# Altium footprint library mobinbyn-Socket.PcbLib: 131 footprints (part 5 of 9)
Each footprint in its own frame and in the unit in brackets; x right, y up, seen from the top. Pads: shape width x height; smd on the part's side, far side on the other; paste and mask are expansions set on the pad; w line width, h text height; cw(c..) or ccw(c..) is an arc to the next point about the centre after c.
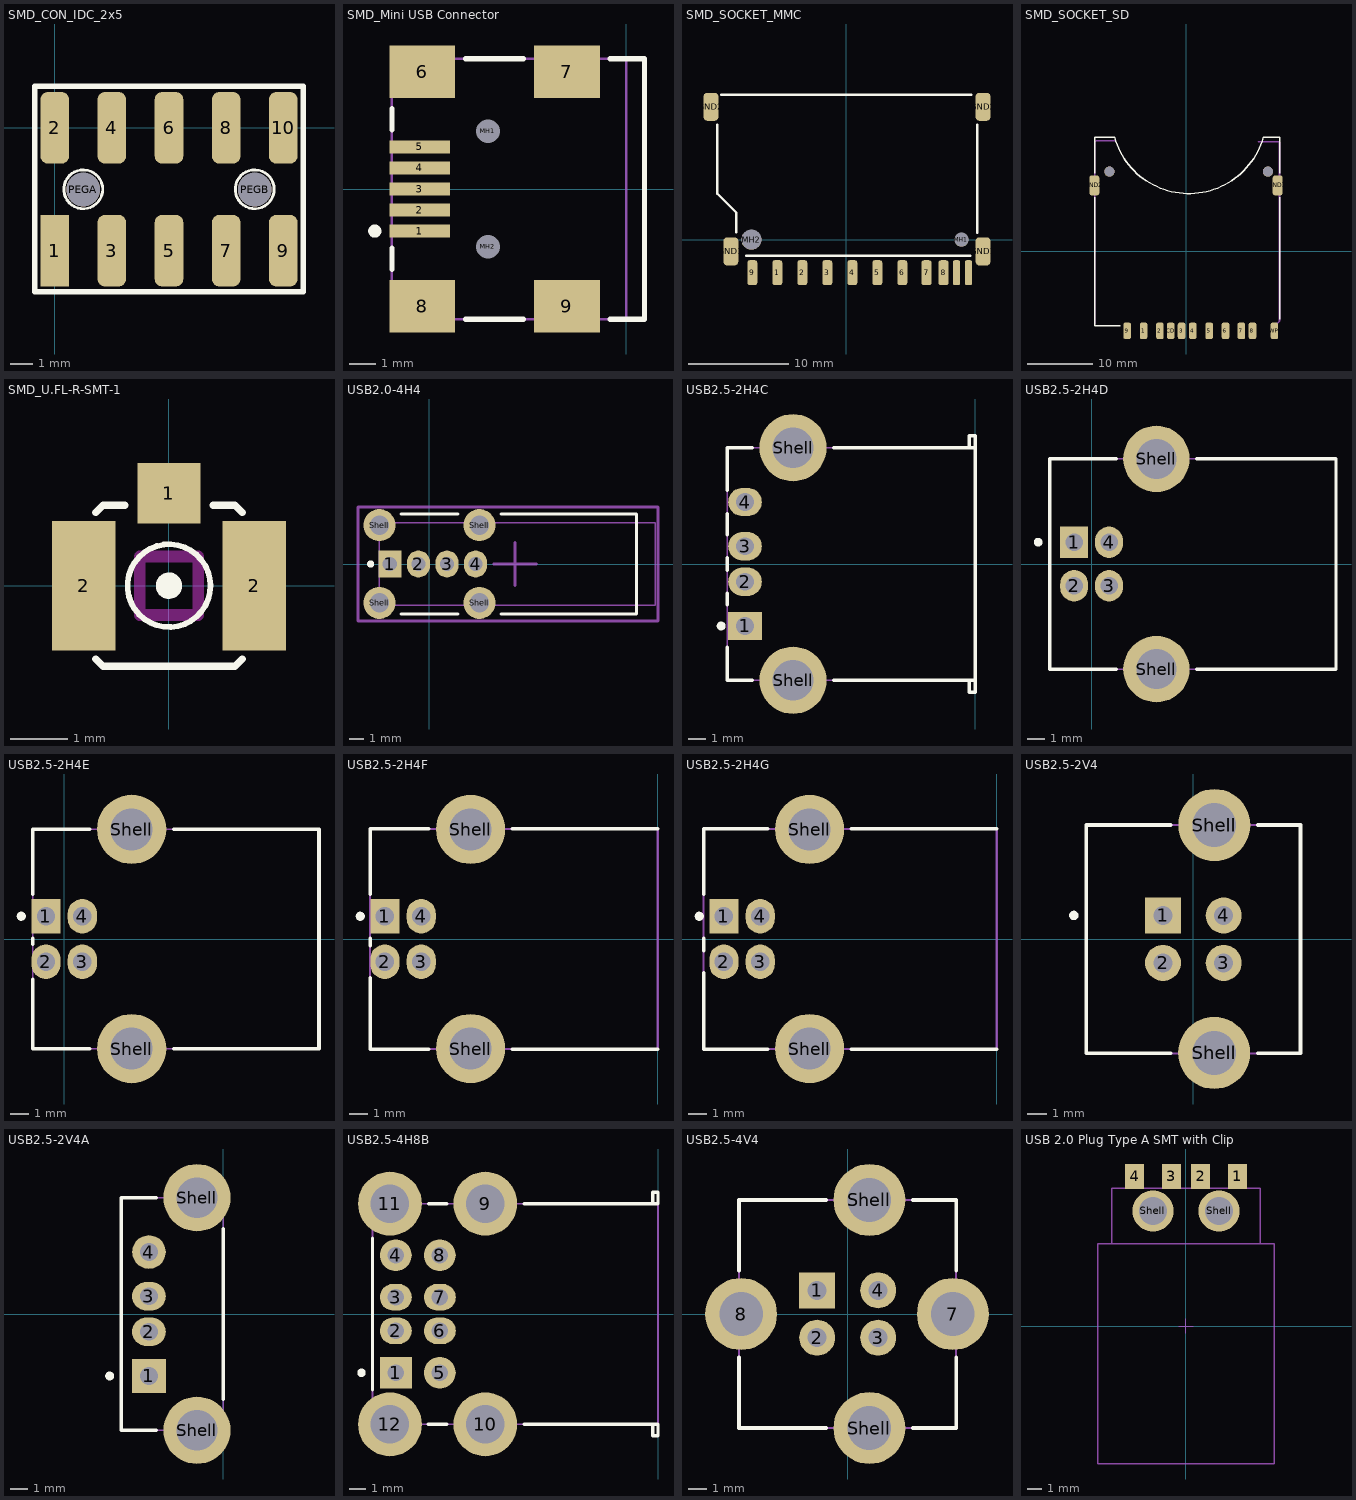
[diagram p4: the footprints below, top view; thin cyan lines are the x and y axes]

## SMD_CON_IDC_2x5 [mil]
pads (12):
  rect 50x125 smd: 1(0,-215)
  rrect50% 50x125 smd: 2(0,0) 3(100,-215) 4(100,0) 5(200,-215) 6(200,0) 7(300,-215) 8(300,0) 9(400,-215) 10(400,0)
  round 59.05 hole 59.06 unplated mask+1.5: PEGA(50,-108) PEGB(350,-108)
Top Overlay:
  circle w5: c350,-107.52 r34.06
  circle w5: c50,-107.52 r34.06
  lines w10: -35,-287 -35,73 435,73 435,-287 -35,-287
3D body "TSM-105-01-X-DV-A.STEP": height 380, standoff -50, extent -52.1,-253.19 447.9,36.8
3D body "10 Pin (2.5 mm Pitch) IDC Connector.stp": height 3028.11, standoff 154.09, extent -142.37,-270.22 538.39,60.43

## SMD_Mini USB Connector [mm]
pads (11):
  rect 2.3x0.5 smd: 1(-7.85,-1.6) 2(-7.85,-0.8) 3(-7.85,0) 4(-7.85,0.8) 5(-7.85,1.6)
  rect 2.5x2 smd: 6(-7.75,4.45) 7(-2.25,4.45) 8(-7.75,-4.45) 9(-2.25,-4.45)
  round 0.6 hole 0.9 unplated: MH1(-5.25,2.2) MH2(-5.25,-2.2)
Top Overlay:
  circle w0.25: c-9.55,-1.6 r0.125
  lines w0.2: -8.9,-3.05 -8.9,-2.25 ; -8.9,2.25 -8.9,3.05 ; -6.1,-4.95 -3.9,-4.95 ; -6.1,4.95 -3.9,4.95 ; -0.6,-4.95 0.7,-4.95 0.7,4.95 -0.6,4.95
Mechanical 1:
  lines w0.1: 0,-4.95 0,4.95
  text "PCB Edge" at 0.432,-4.036 h0.25
Mechanical 13:
  lines w0.1: -8.9,-4.95 0.7,-4.95 0.7,4.95 -8.9,4.95 -8.9,-4.95
3D body "usb_a-usb_b-m5-smd-c.STEP": height 3.93, standoff -1, extent -8.6,-4.95 0.65,4.95

## SMD_SOCKET_MMC [mm]
height 2
pads (17):
  rrect50% 1x2.5 smd: 1(-6.915,-3.3) 2(-4.415,-3.3) 3(-1.915,-3.3) 4(0.585,-3.3) 5(3.085,-3.3) 6(5.585,-3.3) 7(8.01,-3.3) 8(9.71,-3.3) 9(-9.415,-3.3)
  rrect50% 0.7x2.5 smd: CD(11.01,-3.3) WP(12.21,-3.3)
  rrect50% 1.5x2.8 smd: GND1(-11.56,-1.166) GND1(13.66,-1.166) GND2(-13.544,13.3) GND2(13.66,13.3)
  round 1.4 hole 1.4: MH1(11.5,0)
  round 2 hole 2: MH2(-9.5,0)
Top Overlay:
  lines w0.254: -12.9,11.506 -12.9,4.6 -11,2.7 -11,0.764 ; -12.5,14.5 12.5,14.5 ; -10,-1.6 12.4,-1.6 ; 13.1,0.711 13.1,11.506
3D body "693063020911.stp": height 2.95, standoff -0.6, extent -13.39,-3.285 13.61,14.465
3D body "SD card.stp": height 2.23, standoff 0.13, extent -11.716,0.715 12.284,32.715

## SMD_SOCKET_SD [mm] "KSDC012551"
pads (15):
  rrect50% 1.16x2.5 smd: 1(-6.48,-12.15) 2(-3.98,-12.15) 3(-0.68,-12.15) 4(1.03,-12.15) 5(3.53,-12.15) 6(6.03,-12.15) 7(8.45,-12.15) 8(10.15,-12.15) 9(-8.98,-12.15) CD(-2.33,-12.15) WP(13.5,-12.15)
  rrect50% 1.524x3.048 smd: GND1(14,10.05) GND2(-14,10.05)
  round 1.55 hole 1.55 unplated: MH1(12.5,12.15) MH2(-11.7,12.15)
Top Overlay:
  lines w0.2: -13.919,8.255 -13.919,-11.4 -10,-11.4 ; -13.919,11.938 -13.919,17.396 -10.915,17.396 ccw(c0.441,20.6) 11.799,17.4 14.275,17.4 14.275,11.938 ; 14.275,-10.414 14.275,8.255
Mechanical 13:
  lines w0.254: -13.919,-11.024 -13.919,16.662 -13.716,16.866 -10.871,16.866 ; 11.024,16.739 14.122,16.739 14.275,16.586 14.275,-10.684 13.813,-11.146
3D body "SD card.stp": height 2.23, standoff 0.13, extent -11.58,-10.395 12.42,21.605
3D body "c-1734472-1-a2-3d.stp": height 2.73, standoff -0.63, extent -14.3,-12.573 14.2,17.727

## SMD_U.FL-R-SMT-1 [mm]
pads (3):
  rect 1.1x1.05 smd: 1(0,1.6)
  rect 1.1x2.25 smd: 2(-1.475,0) 2(1.475,0)
Top Overlay:
  circle w0.1: c0,0 r0.718
  circle w0.1: c0,0 r0.18
  region: 0,-0.18 -0.036,-0.18 -0.102,-0.152 -0.152,-0.102 -0.18,-0.036 -0.18,0 -0.18,0.036 -0.152,0.102 -0.102,0.152 -0.036,0.18 0,0.18 0.036,0.18 0.102,0.152 0.152,0.102 0.18,0.036 0.18,0 0.18,-0.036 0.152,-0.102 0.102,-0.152 0.036,-0.18
  lines w0.127: -1.27,-1.27 -1.143,-1.397 1.143,-1.397 1.27,-1.27 ; -1.27,1.27 -1.143,1.397 -0.762,1.397 ; 0.762,1.397 1.143,1.397 1.27,1.27
Keep-Out Layer:
  lines w0.203: -0.508,-0.508 0.508,-0.508 0.508,0.508 -0.508,0.508 -0.508,-0.508
3D body "SW3dPS-U.FL-R-SMT-1.STEP": height 1.25, standoff -0.01, extent -1.5,-1.55 1.5,1.55

## USB2.0-4H4 [mm] "Connector; USB1.1, Type A, Thru-Hole; 4 Position; Right Angle"
height 13.83
pads (8):
  rect 1.6x1.9 hole 1: 1(-2.77,0)
  oval 1.6x1.9 hole 1: 2(-0.77,0) 3(1.23,0) 4(3.23,0)
  round 2.25 hole 1.35: Shell(-3.5,-2.72) Shell(-3.5,2.72) Shell(3.5,-2.72) Shell(3.5,2.72)
Top Overlay:
  circle w0.25: c-4.12,0 r0.125
  lines w0.2: -1.98,-3.5 2,-3.5 ; -1.98,3.5 2,3.5 ; 5.01,-3.5 14.5,-3.5 14.5,3.5 5.01,3.5
Mechanical 13:
  lines w0.1: -3.5,-2.88 -3.5,2.88 15.79,2.88 15.79,-2.88 -3.5,-2.88
Mechanical 15:
  lines w0.2: 4.5,0 7.5,0 ; 6,-1.5 6,1.5 ; -5,-4 16,-4 16,4 -5,4 -5,-4
3D body "usb_a-usb_a-e.stp": height 14.25, standoff -3.9, extent -3.995,-3.564 15.255,3.556

## USB2.5-2H4C [mm] "Connector; USB1.1, Type A, Thru-Hole; 4 Position; Right Angle"
height 7.01
pads (6):
  rect 1.9x1.6 hole 1: 1(-12.99,-3.5)
  oval 1.9x1.6 hole 1: 2(-12.99,-1) 3(-12.99,1) 4(-12.99,3.5)
  round 3.8 hole 2.3: Shell(-10.28,-6.57) Shell(-10.28,6.57)
Top Overlay:
  circle w0.25: c-14.34,-3.5 r0.125
  lines w0.2: -14,-4.7 -14,-6.565 -12.58,-6.565 ; -14,-2.3 -14,-1.66 ; -14,-0.34 -14,0.34 ; -14,1.66 -14,2.84 ; -14,4.16 -14,6.565 -12.58,6.565 ; -7.98,-6.565 0,-6.565 ; -7.98,6.565 0,6.565 ; -0.32,-6.565 -0.32,-7.25 0,-7.25 0,-6.565 ; -0.32,6.565 -0.32,7.25 0,7.25 0,6.565 ; 0,-6.565 0,6.565
Mechanical 13:
  lines w0.1: -14,-6.565 -14,6.565 -0.32,6.565 -0.32,7.25 0,7.25 0,-7.25 -0.32,-7.25 -0.32,-6.565 -14,-6.565
3D body "14388.STEP": height 7.35, standoff -3.5, extent -14.402,-7.9 0.098,7.9

## USB2.5-2H4D [mm] "Connector; USB1.1, Type B, Thru-Hole; 4 Position; Right Angle"
height 11.1
pads (6):
  rect 1.6x1.8 hole 1: 1(-1,1.25)
  oval 1.6x1.8 hole 1: 2(-1,-1.25) 3(1,-1.25) 4(1,1.25)
  round 3.8 hole 2.3: Shell(3.71,-6.02) Shell(3.71,6.02)
Top Overlay:
  circle w0.25: c-3.06,1.25 r0.125
  lines w0.2: 1.41,-6.02 -2.41,-6.02 -2.41,6.02 1.41,6.02 ; 6.01,-6.02 13.99,-6.02 13.99,6.02 6.01,6.02
Mechanical 13:
  lines w0.1: -2.41,-6.02 13.99,-6.02 13.99,6.02 -2.41,6.02 -2.41,-6.02
3D body "Samtec-DEFAULT.STEP": height 11.05, standoff 0.55, extent 3.937,-5.625 69.887,5.575
3D body "14389.STEP": height 10.95, standoff -3.7, extent -2.5,-7.45 14,7.45

## USB2.5-2H4E [mm] "Connector; USB1.1, Type B, Thru-Hole; 4 Position; Right Angle"
height 11.5
pads (6):
  rect 1.6x1.9 hole 1: 1(-1,1.25)
  oval 1.6x1.9 hole 1: 2(-1,-1.25) 3(1,-1.25) 4(1,1.25)
  round 3.8 hole 2.3: Shell(3.71,-6.02) Shell(3.71,6.02)
Top Overlay:
  circle w0.25: c-2.35,1.25 r0.125
  lines w0.2: -1.72,-2.21 -1.72,-6.02 1.41,-6.02 ; -1.72,-0.29 -1.72,0.05 ; -1.72,2.45 -1.72,6.02 1.41,6.02 ; 6.01,-6.02 13.99,-6.02 13.99,6.02 6.01,6.02
Mechanical 13:
  lines w0.1: -1.72,-6.02 -1.72,6.02 13.99,6.02 13.99,-6.02 -1.72,-6.02
3D body "14389.STEP": height 10.95, standoff -3.7, extent -2.5,-7.45 14,7.45

## USB2.5-2H4F [mm] "Connector; USB1.1, Type B, Thru-Hole; 4 Position; Right Angle"
height 10.95
pads (6):
  rect 1.6x1.9 hole 1: 1(-15.01,1.25)
  oval 1.6x1.9 hole 1: 2(-15.01,-1.25) 3(-13.01,-1.25) 4(-13.01,1.25)
  round 3.8 hole 2.3: Shell(-10.3,-6.02) Shell(-10.3,6.02)
Top Overlay:
  circle w0.25: c-16.36,1.25 r0.125
  lines w0.2: -15.82,-2.14 -15.82,-6.05 -12.6,-6.05 ; -15.82,-0.36 -15.82,0.05 ; -15.82,2.45 -15.82,6.05 -12.6,6.05 ; -8,-6.05 -0.02,-6.05 ; -8,6.05 -0.02,6.05
Mechanical 1:
  lines w0.1: 0,-6.05 0,6.05
  text "PCB Edge" at -0.325,-5.651 h0.25
Mechanical 13:
  lines w0.1: -15.82,-6.05 -0.02,-6.05 -0.02,6.05 -15.82,6.05 -15.82,-6.05
3D body "14389.STEP": height 10.95, standoff -3.7, extent -16.51,-7.45 -0.01,7.45

## USB2.5-2H4G [mm] "Connector; USB1.1, Type B, Thru-Hole; 4 Position; Right Angle"
height 10.95
pads (6):
  rect 1.6x1.9 hole 1: 1(-15.01,1.25)
  oval 1.6x1.9 hole 1: 2(-15.01,-1.25) 3(-13.01,-1.25) 4(-13.01,1.25)
  round 3.8 hole 2.3: Shell(-10.3,-6.02) Shell(-10.3,6.02)
Top Overlay:
  circle w0.25: c-16.36,1.25 r0.125
  lines w0.2: -16.12,-1.85 -16.12,-6.05 -12.6,-6.05 ; -16.12,-0.65 -16.12,0.05 ; -16.12,2.45 -16.12,6.05 -12.6,6.05 ; -8,-6.05 -0.02,-6.05 ; -8,6.05 -0.02,6.05
Mechanical 1:
  lines w0.1: 0,-6.05 0,6.05
  text "PCB Edge" at -0.325,-5.651 h0.25
Mechanical 13:
  lines w0.1: -16.12,-6.05 -16.12,6.05 -0.02,6.05 -0.02,-6.05 -16.12,-6.05
3D body "Samtec-DEFAULT.STEP": height 11.05, standoff 0.55, extent -10.073,-5.625 55.877,5.575
3D body "14389.STEP": height 10.95, standoff -3.7, extent -16.51,-7.45 -0.01,7.45

## USB2.5-2V4 [mm] "Connector; USB1.1, Type B, Thru-Hole; 4 Position; Vertical"
height 16
pads (6):
  rect 1.9x1.9 hole 1: 1(-1.6,1.25)
  round 1.9 hole 1: 2(-1.6,-1.25) 3(1.6,-1.25) 4(1.6,1.25)
  round 3.8 hole 2.3: Shell(1.1,-6) Shell(1.11,6.02)
Top Overlay:
  circle w0.25: c-6.3,1.25 r0.125
  lines w0.2: -1.19,-6.02 -5.65,-6.02 -5.65,6.02 -1.19,6.02 ; 3.41,-6.02 5.65,-6.02 5.65,6.02 3.41,6.02
Mechanical 13:
  lines w0.1: -5.65,-6.02 -5.65,6.02 5.65,6.02 5.65,-6.02 -5.65,-6.02
3D body "12039.STEP": height 15.62, standoff -4.02, extent -5.753,-7.571 5.703,7.571

## USB2.5-2V4A [mm] "Connector; USB1.1, Type A, Thru-Hole; 4 Position; Vertical"
height 15
pads (6):
  rect 1.9x1.9 hole 1: 1(-4.19,-3.5)
  oval 1.9x1.6 hole 1: 2(-4.19,-1) 3(-4.19,1)
  round 1.9 hole 1: 4(-4.19,3.5)
  round 3.8 hole 2.3: Shell(-1.48,-6.57) Shell(-1.48,6.57)
Top Overlay:
  circle w0.25: c-6.41,-3.5 r0.125
  lines w0.2: -3.78,-6.57 -5.76,-6.57 -5.76,6.57 -3.78,6.57 ; 0,-4.81 0,4.81
Mechanical 13:
  lines w0.1: -5.76,-6.57 0,-6.57 0,6.57 -5.76,6.57 -5.76,-6.57
3D body "14382.STEP": height 15, standoff -2.99, extent -6.7,-7.991 0.94,7.992

## USB2.5-4H8B [mm] "Connector; USB1.1, Type A, Thru-Hole; 4x4 Position; Right Angle"
height 15.82
pads (12):
  rect 1.9x1.9 hole 1: 1(-15.61,-3.5)
  oval 1.9x1.6 hole 1: 2(-15.61,-1) 3(-15.61,1) 6(-12.99,-1) 7(-12.99,1)
  round 1.9 hole 1: 4(-15.61,3.5) 5(-12.99,-3.5) 8(-12.99,3.5)
  round 3.8 hole 2.3: 9(-10.28,6.57) 10(-10.28,-6.57) 11(-15.96,6.57) 12(-15.96,-6.57)
Top Overlay:
  circle w0.25: c-17.65,-3.5 r0.125
  lines w0.2: -17,-4.51 -17,4.51 ; -13.68,-6.57 -12.58,-6.57 ; -13.66,6.57 -12.58,6.57 ; -7.97,-6.57 0,-6.57 0,-7.25 -0.32,-7.25 -0.32,-6.57 ; -7.97,6.57 0,6.57 0,7.25 -0.32,7.25 -0.32,6.57
Mechanical 1:
  lines w0.1: 0,-6.57 0,6.57
  text "PCB Edge" at -0.368,-6.15 h0.2
Mechanical 13:
  lines w0.1: -17,-7.25 -17,7.25 ; -17,-6.57 -0.32,-6.57 -0.32,-7.25 0,-7.25 0,7.25 -0.32,7.25 -0.32,6.57 -17,6.57
3D body "14378.STEP": height 15.6, standoff -3.8, extent -17,-7.849 0.598,7.851

## USB2.5-4V4 [mm] "Connector; USB1.1, Type B, Thru-Hole; 4 Position; Vertical"
height 15.62
pads (8):
  rect 1.9x1.9 hole 1: 1(-1.61,1.25)
  round 1.9 hole 1: 2(-1.61,-1.25) 3(1.61,-1.25) 4(1.61,1.25)
  round 3.8 hole 2.3: 7(5.56,0) 8(-5.63,0) Shell(1.15,-6.02) Shell(1.15,6.02)
Top Overlay:
  lines w0.2: -5.73,-2.3 -5.73,-6.02 -1.15,-6.02 ; -5.73,2.3 -5.73,6.02 -1.15,6.02 ; 3.45,-6.02 5.73,-6.02 5.73,-2.3 ; 3.45,6.02 5.73,6.02 5.73,2.3
Mechanical 13:
  lines w0.1: -5.73,-6.02 -5.73,6.02 5.73,6.02 5.73,-6.02 -5.73,-6.02
3D body "5881.STEP": height 15.8, standoff -4.74, extent -5.65,-7.55 5.85,7.55

## USB 2.0 Plug Type A SMT with Clip [mm] "USB 2.0 Plug Type A SMT with Clip"
height 19.8
pads (6):
  rect 1.3x1.7 smd: 1(3.5,10.2) 2(1,10.2) 3(-1,10.2) 4(-3.5,10.2)
  round 2.8 hole 1.9: Shell(-2.25,7.85) Shell(2.25,7.85)
Mechanical 2:
  lines w0.1: -6,5.6 6,5.6
Mechanical 13:
  lines w0.1: -4.05,9.4 -4.05,10.4 -2.95,10.4 -2.95,9.4 ; -1.55,9.4 -1.55,10.4 -0.45,10.4 -0.45,9.4 ; 0.45,9.4 0.45,10.4 1.55,10.4 1.55,9.4 ; 2.95,9.4 2.95,10.4 4.05,10.4 4.05,9.4 ; -6,-9.4 6,-9.4 6,5.6 5.05,5.6 5.05,9.4 -5.05,9.4 -5.05,5.6 -6,5.6 -6,-9.4
Mechanical 15:
  lines w0.05: -0.5,0 0.5,0 ; 0,-0.5 0,0.5
3D body "629004113921.stp": height 2.25, standoff -2.25, extent -6,-9.4 6,10.4